# Altium footprint library Connector.PcbLib: 117 footprints (part 8 of 8)
Each footprint in its own frame and in the unit in brackets; x right, y up, seen from the top. Pads: shape width x height; smd on the part's side, far side on the other; paste and mask are expansions set on the pad; w line width, h text height; cw(c..) or ccw(c..) is an arc to the next point about the centre after c.
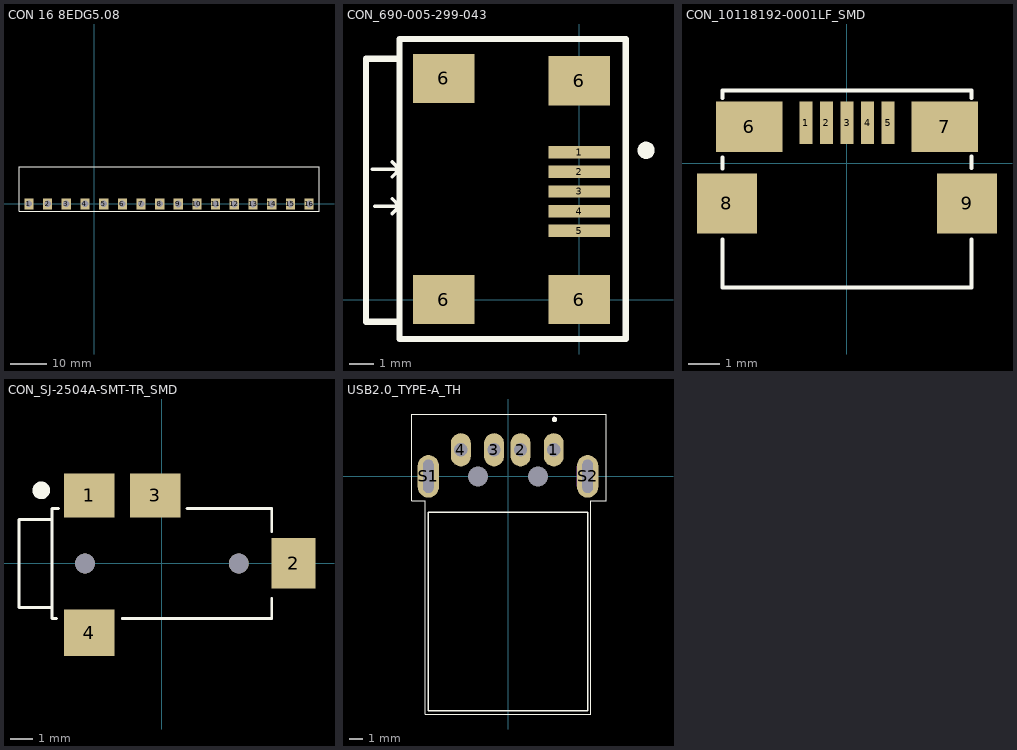
[diagram p7: the footprints below, top view; thin cyan lines are the x and y axes]

## CON 16 8EDG5.08 [mm]
pads (16):
  rect 2.5x3 hole 1.8: 1(-17.78,0) 2(-12.7,0) 3(-7.62,0) 4(-2.54,0) 5(2.54,0) 6(7.62,0) 7(12.7,0) 8(17.78,0) 9(22.794,-0.011) 10(27.874,-0.011) 11(32.954,-0.011) 12(38.034,-0.011) 13(43.114,-0.011) 14(48.194,-0.011) 15(53.274,-0.011) 16(58.354,-0.011)
Top Overlay:
  lines w0.254: -3.937,10.16 20.475,10.16 ; 0,10.16 -20.475,10.16 -20.475,-2.032 -10.16,-2.032 0,-2.032 10.16,-2.032 20.475,-2.032 ; 20.099,-2.043 30.414,-2.043 40.574,-2.043 50.734,-2.043 61.049,-2.043 61.049,10.149 36.637,10.149 ; 20.099,10.149 40.574,10.149
3D body "User Library-BigHeader 5EHDR_1P.step": height 3.15, standoff -9.32, extent 55.872,-1.761 60.872,10.239
3D body "User Library-BigHeader 5EHDR_1P.step": height 3.15, standoff -9.32, extent 50.792,-1.761 55.792,10.239
3D body "User Library-BigHeader 5EHDR_1P.step": height 3.15, standoff -9.32, extent 45.712,-1.761 50.712,10.239
3D body "User Library-BigHeader 5EHDR_1P.step": height 3.15, standoff -9.32, extent 40.632,-1.761 45.632,10.239
3D body "User Library-BigHeader 5EHDR_1P.step": height 3.15, standoff -9.32, extent 35.552,-1.761 40.552,10.239
3D body "User Library-BigHeader 5EHDR_1P.step": height 3.15, standoff -9.32, extent 30.472,-1.761 35.472,10.239
3D body "User Library-BigHeader 5EHDR_1P.step": height 3.15, standoff -9.32, extent 25.392,-1.761 30.392,10.239
3D body "User Library-BigHeader 5EHDR_1P.step": height 3.15, standoff -9.32, extent 20.312,-1.761 25.312,10.239
3D body "User Library-BigHeader 5EHDR_1P.step": height 3.15, standoff -9.32, extent 15.28,-1.75 20.28,10.25
3D body "User Library-BigHeader 5EHDR_1P.step": height 3.15, standoff -9.32, extent 10.2,-1.75 15.2,10.25
3D body "User Library-BigHeader 5EHDR_1P.step": height 3.15, standoff -9.32, extent 5.12,-1.75 10.12,10.25
3D body "User Library-BigHeader 5EHDR_1P.step": height 3.15, standoff -9.32, extent 0.04,-1.75 5.04,10.25
3D body "User Library-BigHeader 5EHDR_1P.step": height 3.15, standoff -9.32, extent -5.04,-1.75 -0.04,10.25
3D body "User Library-BigHeader 5EHDR_1P.step": height 3.15, standoff -9.32, extent -10.12,-1.75 -5.12,10.25
3D body "User Library-BigHeader 5EHDR_1P.step": height 3.15, standoff -9.32, extent -15.2,-1.75 -10.2,10.25
3D body "User Library-BigHeader 5EHDR_1P.step": height 3.15, standoff -9.32, extent -20.28,-1.75 -15.28,10.25

## CON_690-005-299-043 [mm] "USB MINI-B"
height 6.5
pads (9):
  rect 2.5x0.5 smd: 1(0,6) 2(0,5.2) 3(0,4.4) 4(0,3.6) 5(0,2.8)
  rect 2.5x2 smd: 6(-5.5,0) 6(-5.5,9) 6(0,0) 6(0,8.9)
Top Overlay:
  circle w0.381: c2.725,6.075 r0.158
  lines w0.152: -8.4,5.3 -7.4,5.3 ; -8.3,3.8 -7.4,3.8 ; -7.6,3.5 -7.3,3.8 -7.6,4.1 ; -7.6,5 -7.3,5.3 -7.6,5.6
  lines w0.254: -8.4,9.8 -7.3,9.8 ; -7.3,-0.9 -8.661,-0.9 -8.661,9.8 -7.3,9.8 ; -7.3,5 -7.3,4.9 ; -7.3,9.7 -7.3,10.6 1.9,10.6 1.9,-1.6 -7.3,-1.6 -7.3,9.8 ; -7.3,4.9 -7.3,4.9
3D body "5889.stp": height 3.96, standoff 0.01, extent -8.4,-0.55 0.6,9.35

## CON_10118192-0001LF_SMD [mm] "USB2.0 MICRO"
height 1.85
pads (9):
  rect 0.4x1.35 smd: 1(-1.3,1.275) 2(-0.65,1.275) 3(0,1.275) 4(0.65,1.275) 5(1.3,1.275)
  rect 2.1x1.6 smd: 6(-3.1,1.15) 7(3.1,1.15)
  rect 1.9x1.9 smd: 8(-3.8,-1.275) 9(3.8,-1.275)
Top Overlay:
  lines w0.127: -3.95,-2.421 -3.95,-3.945 3.95,-3.945 3.95,-2.421 ; -3.95,-0.178 -3.95,0.178 ; -3.95,2.057 -3.95,2.3 3.95,2.3 3.95,2.057 ; 3.95,-0.152 3.95,0.203
3D body "zx62-b-5pa_33_.stp": height 2.81, standoff -0.14, extent -4.037,-3.945 4.037,1.655

## CON_SJ-2504A-SMT-TR_SMD [mm]
pads (6):
  rect 2.3x2 smd: 1(-3.3,3.1) 3(-0.3,3.1)
  rect 2x2.3 smd: 2(6,0)
  rect 2.3x2.1 smd: 4(-3.3,-3.15)
  round 0.9 hole 0.9 unplated: ""(-3.5,0) ""(3.5,0)
Top Overlay:
  circle w0.4: c-5.486,3.327 r0.2
  lines w0.127: -4.8,-2.5 -5,-2.5 -5,-2 ; -4.7,2.5 -5,2.5 -5,2 ; -1.8,-2.5 5,-2.5 5,-1.6 ; 1.15,2.5 5,2.5 5,1.45 ; -5,-2 -6.5,-2 -6.5,2 -5,2 ; -5,-2 -5,2
3D body "User Library-JY2512.step": height 4.01, standoff -0.79, extent -6.5,-4 6.5,4

## USB2.0_TYPE-A_TH [mm] "USB 2.0 TYPE A"
height 4.5
pads (8):
  oval 1.5x2.5 hole 1: 1(3.449,2) 2(0.949,2) 3(-1.051,2) 4(-3.551,2)
  round 1.1 hole 1.5 unplated: None(-2.25,0) None(2.25,0)
  oval 1.6x3.2 hole 0.8 slot 2.5 at 90 deg: S1(-6,0) S2(6,0)
Top Overlay:
  circle w0.2: c3.499,4.294 r0.1
  lines w0.05: -7.239,-1.85 -7.239,4.699 7.391,4.699 7.391,-1.85 6.25,-1.85 6.25,-17.9 -6.25,-17.9 -6.25,-1.85 -7.239,-1.85
  lines w0.127: -6,-17.65 6,-17.65 ; -6,-17.65 6,-17.65 ; -6,-17.65 -6,-2.7 ; -6,-17.65 -6,-2.7 ; -6,-2.7 6,-2.7 ; -6,-2.7 6,-2.7 ; -6,-2.7 6,-2.7 ; -6,-2.7 6,-2.7 ; 6,-17.65 6,-2.7 ; 6,-17.65 6,-2.7
Mechanical 1:
  lines w0: -6.2,-0.75 ccw(c-5.7,-0.75) -5.2,-0.75 -5.2,0.75 ccw(c-5.7,0.75) -6.2,0.75 -6.2,-0.75 ; 5.2,-0.75 ccw(c5.7,-0.75) 6.2,-0.75 6.2,0.75 ccw(c5.7,0.75) 5.2,0.75 5.2,-0.75
Mechanical 4:
  circle w0.2: c3.499,4.294 r0.1
  circle w0.2: c3.499,4.294 r0.1
3D body "User Library-USB 2_0 Type A Male v2.step": height 4.5, standoff -2.5, extent -6.179,-18.091 6.248,3.511